# Altium footprint library PcbLib1.PcbLib: 33 footprints (part 3 of 3)
Each footprint in its own frame and in the unit in brackets; x right, y up, seen from the top. Pads: shape width x height; smd on the part's side, far side on the other; paste and mask are expansions set on the pad; w line width, h text height; cw(c..) or ccw(c..) is an arc to the next point about the centre after c.
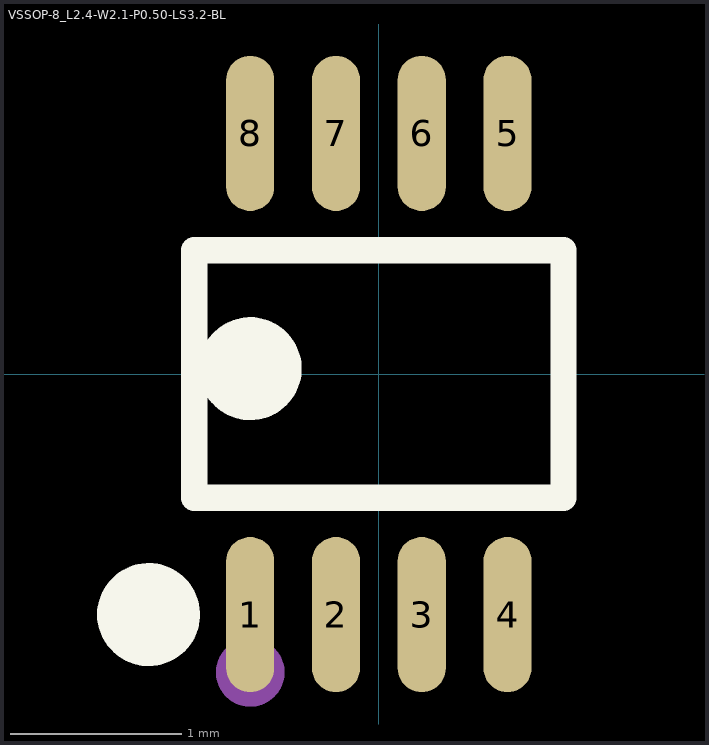
[diagram p2: the footprint, top view; thin cyan lines are the x and y axes]

## VSSOP-8_L2.4-W2.1-P0.50-LS3.2-BL [mm]
pads (8):
  oval 0.28x0.905 smd: 1(-0.75,-1.403) 2(-0.25,-1.403) 3(0.25,-1.403) 4(0.75,-1.403) 5(0.75,1.403) 6(0.25,1.403) 7(-0.25,1.403) 8(-0.75,1.403)
Top Overlay:
  circle w0.3: c-0.75,0.031 r0.15
  circle w0.3: c-1.342,-1.403 r0.15
  lines w0.152: -1.076,-0.721 -1.076,0.721 1.076,0.721 1.076,-0.721 -1.076,-0.721
Mechanical 15:
  circle w0.2: c-0.75,-1.74 r0.1